# Altium footprint library Custom2.PcbLib: 99 footprints (part 5 of 7)
Each footprint in its own frame and in the unit in brackets; x right, y up, seen from the top. Pads: shape width x height; smd on the part's side, far side on the other; paste and mask are expansions set on the pad; w line width, h text height; cw(c..) or ccw(c..) is an arc to the next point about the centre after c.
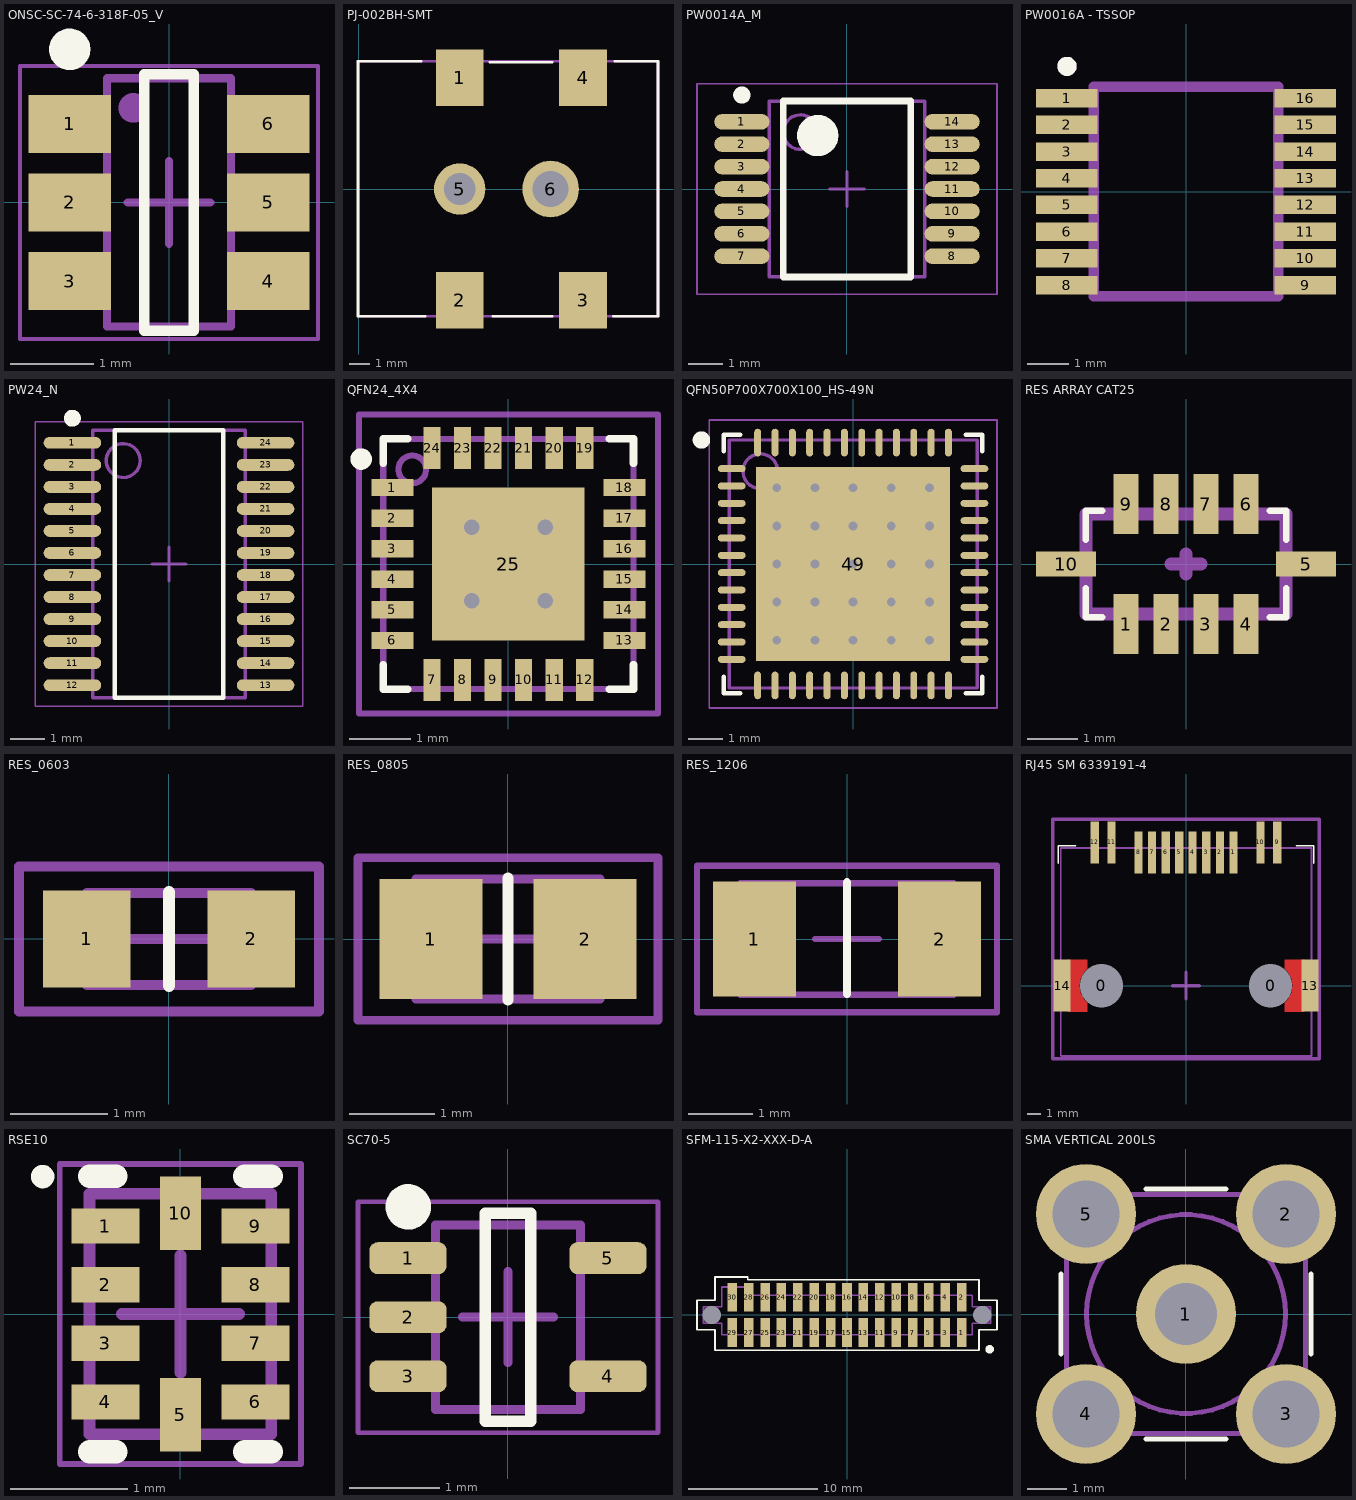
[diagram p4: the footprints below, top view; thin cyan lines are the x and y axes]

## ONSC-SC-74-6-318F-05_V [mm]
pads (6):
  rect 1x0.7 smd: 1(-1.2,0.95) 2(-1.2,0) 3(-1.2,-0.95) 4(1.2,-0.95) 5(1.2,0) 6(1.2,0.95)
Top Overlay:
  circle w0.25: c-1.2,1.85 r0.125
  lines w0.127: -0.3,-1.55 0.3,-1.55 0.3,1.55 -0.3,1.55 -0.3,-1.55
Mechanical 13:
  circle w0.254: c-0.432,1.143 r0.051
  lines w0.1: -0.75,-1.5 -0.75,1.5 0.75,1.5 0.75,-1.5 -0.75,-1.5
  text "'.Designator'" at -1.524,1.422 h0.76
Mechanical 15:
  lines w0.05: -1.8,-1.65 -1.8,1.65 1.8,1.65 1.8,-1.65 -1.8,-1.65
  lines w0.1: -0.5,0 0.5,0 ; 0,-0.5 0,0.5
3D body "NUD3124.step": height 0.95, standoff -0.07, extent -1.386,-1.5 1.385,1.5
3D body: height 0.97, standoff 0.94, extent -0.483,0.763 0.023,1.27

## PJ-002BH-SMT [mil]
pads (6):
  rect 93x110 smd: 1(197,217) 2(197,-217) 3(437,-217) 4(437,217)
  round 100 hole 62: 5(197,0)
  round 110 hole 70: 6(374,0)
Top Overlay:
  lines w5: 122,249 -1,249 -1,-248 130,-248 ; 256,247 377,247 ; 261,-248 377,-248 ; 496,-248 583,-248 583,249 499,249
Mechanical 13:
  lines w5: -1,249 -0.69,248.69 -0.69,-247.91 -0.6,-248 583,-248 583,249 -1,249
  text "'.Designator'" at 241.82,-19.83 h30
3D body "PJ-002BH-SMT.STEP": height 433.55, standoff -46.76, extent -0.69,-248.19 582.22,248.15

## PW0014A_M [mm] "SOP, 14-Leads, Body 5.1x4.5mm, Pitch 0.65mm, IPC Low Density"
height 1.2
pads (14):
  oval 1.6x0.45 smd: 1(-3.05,1.95) 2(-3.05,1.3) 3(-3.05,0.65) 4(-3.05,0) 5(-3.05,-0.65) 6(-3.05,-1.3) 7(-3.05,-1.95) 8(3.05,-1.95) 9(3.05,-1.3) 10(3.05,-0.65) 11(3.05,0) 12(3.05,0.65) 13(3.05,1.3) 14(3.05,1.95)
Top Overlay:
  circle w0.25: c-3.05,2.725 r0.125
  circle w0.6: c-0.85,1.55 r0.3
  lines w0.2: -1.85,-2.55 -1.85,2.55 1.85,2.55 1.85,-2.55 -1.85,-2.55
Mechanical 13:
  circle w0.1: c-1.35,1.65 r0.5
  lines w0.1: -2.25,-2.55 -2.25,2.55 2.25,2.55 2.25,-2.55 -2.25,-2.55
Mechanical 15:
  lines w0.05: -4.35,-3.05 -4.35,3.05 4.35,3.05 4.35,-3.05 -4.35,-3.05
  lines w0.1: -0.5,0 0.5,0 ; 0,-0.5 0,0.5
3D body "PW0014AakaMTC14.stp": height 1, standoff 0, extent -3.21,-2.5 3.21,2.5

## PW0016A - TSSOP [mm] "TSSOP"
height 1.2
pads (16):
  rect 1.5x0.45 smd mask+0.051: 1(-2.9,2.275) 2(-2.9,1.625) 3(-2.9,0.975) 4(-2.9,0.325) 5(-2.9,-0.325) 6(-2.9,-0.975) 7(-2.9,-1.625) 8(-2.9,-2.275) 9(2.9,-2.275) 10(2.9,-1.625) 11(2.9,-0.975) 12(2.9,-0.325) 13(2.9,0.325) 14(2.9,0.975) 15(2.9,1.625) 16(2.9,2.275)
Top Overlay:
  circle w0.254: c-2.896,3.048 r0.105
Mechanical 1:
  circle w0.254: c-2.896,3.048 r0.105
  lines w0.254: -2.25,-2.55 2.25,-2.55 2.25,2.55 -2.25,2.55 -2.25,-2.55
3D body "PW16.step": height 1.2, standoff 0, extent -3.327,-2.553 3.277,2.553

## PW24_N [mm]
pads (24):
  oval 1.7x0.35 smd: 1(-2.85,3.575) 2(-2.85,2.925) 3(-2.85,2.275) 4(-2.85,1.625) 5(-2.85,0.975) 6(-2.85,0.325) 7(-2.85,-0.325) 8(-2.85,-0.975) 9(-2.85,-1.625) 10(-2.85,-2.275) 11(-2.85,-2.925) 12(-2.85,-3.575) 13(2.85,-3.575) 14(2.85,-2.925) 15(2.85,-2.275) 16(2.85,-1.625) 17(2.85,-0.975) 18(2.85,-0.325) 19(2.85,0.325) 20(2.85,0.975) 21(2.85,1.625) 22(2.85,2.275) 23(2.85,2.925) 24(2.85,3.575)
Top Overlay:
  circle w0.25: c-2.85,4.3 r0.125
  lines w0.127: -1.6,-3.95 -1.6,3.95 1.6,3.95 1.6,-3.95 -1.6,-3.95
Mechanical 13:
  circle w0.1: c-1.35,3.05 r0.5
  lines w0.1: -2.25,-3.95 -2.25,3.95 2.25,3.95 2.25,-3.95 -2.25,-3.95
  text "'.Designator'" at -0.94,0.483 h0.76
Mechanical 15:
  lines w0.05: -3.95,-4.2 -3.95,4.2 3.95,4.2 3.95,-4.2 -3.95,-4.2
  lines w0.1: -0.5,0 0.5,0 ; 0,-0.5 0,0.5
3D body: height 1.22, standoff 1.19, extent -1.854,2.543 -0.842,3.557
3D body: height 1.2, standoff 0, extent -2.25,-3.95 2.25,3.95

## QFN24_4X4 [mm]
pads (25):
  rect 0.69x0.28 smd: 1(-1.9,1.25) 2(-1.9,0.75) 3(-1.9,0.25) 4(-1.9,-0.25) 5(-1.9,-0.75) 6(-1.9,-1.25) 13(1.9,-1.25) 14(1.9,-0.75) 15(1.9,-0.25) 16(1.9,0.25) 17(1.9,0.75) 18(1.9,1.25)
  rect 0.28x0.69 smd: 7(-1.25,-1.9) 8(-0.75,-1.9) 9(-0.25,-1.9) 10(0.25,-1.9) 11(0.75,-1.9) 12(1.25,-1.9) 19(1.25,1.9) 20(0.75,1.9) 21(0.25,1.9) 22(-0.25,1.9) 23(-0.75,1.9) 24(-1.25,1.9)
  rect 2.5x2.5 smd: 25(0,0)
via 0.6,0.6 diameter 0.508 hole 0.254
via -0.6,0.6 diameter 0.508 hole 0.254
via 0.6,-0.6 diameter 0.508 hole 0.254
via -0.6,-0.6 diameter 0.508 hole 0.254
Top Overlay:
  lines w0.127: -2.05,-1.651 -2.05,-2.05 -1.651,-2.05 ; -2.05,1.651 -2.05,2.05 -1.651,2.05 ; 1.651,-2.05 2.05,-2.05 2.05,-1.651 ; 1.651,2.05 2.05,2.05 2.05,1.651
  lines w0.25: -2.431,1.672 ccw(c-2.413,1.719) -2.431,1.672
Mechanical 13:
  lines w0.1: -2.05,-2.05 2.05,-2.05 2.05,2.05 -2.05,2.05 -2.05,-2.05 ; -1.735,1.389 ccw(c-1.575,1.549) -1.735,1.389
  text "'.Designator'" at -0.483,1.041 h0.76
Mechanical 15:
  lines w0.1: -0.5,0 0.5,0 ; 0,-0.5 0,0.5 ; -2.45,-2.45 2.45,-2.45 2.45,2.45 -2.45,2.45 -2.45,-2.45
3D body: height 1, standoff 0.02, extent -2.05,-2.05 2.05,2.05
3D body: height 1.04, standoff 1.02, extent -1.827,1.296 -1.321,1.803

## QFN50P700X700X100_HS-49N [mm]
pads (49):
  oval 0.8x0.2 smd: 1(-3.5,2.75) 2(-3.5,2.25) 3(-3.5,1.75) 4(-3.5,1.25) 5(-3.5,0.75) 6(-3.5,0.25) 7(-3.5,-0.25) 8(-3.5,-0.75) 9(-3.5,-1.25) 10(-3.5,-1.75) 11(-3.5,-2.25) 12(-3.5,-2.75) 25(3.5,-2.75) 26(3.5,-2.25) 27(3.5,-1.75) 28(3.5,-1.25) 29(3.5,-0.75) 30(3.5,-0.25) 31(3.5,0.25) 32(3.5,0.75) 33(3.5,1.25) 34(3.5,1.75) 35(3.5,2.25) 36(3.5,2.75)
  oval 0.2x0.8 smd: 13(-2.75,-3.5) 14(-2.25,-3.5) 15(-1.75,-3.5) 16(-1.25,-3.5) 17(-0.75,-3.5) 18(-0.25,-3.5) 19(0.25,-3.5) 20(0.75,-3.5) 21(1.25,-3.5) 22(1.75,-3.5) 23(2.25,-3.5) 24(2.75,-3.5) 37(2.75,3.5) 38(2.25,3.5) 39(1.75,3.5) 40(1.25,3.5) 41(0.75,3.5) 42(0.25,3.5) 43(-0.25,3.5) 44(-0.75,3.5) 45(-1.25,3.5) 46(-1.75,3.5) 47(-2.25,3.5) 48(-2.75,3.5)
  rect 5.6x5.6 smd paste-2.794: 49(0,0)
via 2.2,-2.2 diameter 0.508 hole 0.254
via 1.1,-2.2 diameter 0.508 hole 0.254
via 0,-2.2 diameter 0.508 hole 0.254
via -1.1,-2.2 diameter 0.508 hole 0.254
via -2.2,-2.2 diameter 0.508 hole 0.254
via 2.2,-1.1 diameter 0.508 hole 0.254
via 1.1,-1.1 diameter 0.508 hole 0.254
via 0,-1.1 diameter 0.508 hole 0.254
via -1.1,-1.1 diameter 0.508 hole 0.254
via -2.2,-1.1 diameter 0.508 hole 0.254
via 2.2,0 diameter 0.508 hole 0.254
via 1.1,0 diameter 0.508 hole 0.254
via 0,0 diameter 0.508 hole 0.254
via -1.1,0 diameter 0.508 hole 0.254
via -2.2,0 diameter 0.508 hole 0.254
via 2.2,1.1 diameter 0.508 hole 0.254
via 1.1,1.1 diameter 0.508 hole 0.254
via 0,1.1 diameter 0.508 hole 0.254
via -1.1,1.1 diameter 0.508 hole 0.254
via -2.2,1.1 diameter 0.508 hole 0.254
via 2.2,2.2 diameter 0.508 hole 0.254
via 1.1,2.2 diameter 0.508 hole 0.254
via 0,2.2 diameter 0.508 hole 0.254
via -1.1,2.2 diameter 0.508 hole 0.254
via -2.2,2.2 diameter 0.508 hole 0.254
Top Overlay:
  circle w0.25: c-4.375,3.575 r0.125
  lines w0.127: -3.725,-3.25 -3.725,-3.725 -3.25,-3.725 ; -3.725,3.25 -3.725,3.725 -3.25,3.725 ; 3.25,-3.725 3.725,-3.725 3.725,-3.25 ; 3.25,3.725 3.725,3.725 3.725,3.25
Top Paste:
  circle w0.254: c-2.525,1.65 r0.1
  circle w0.254: c-2.525,0.55 r0.1
  circle w0.254: c-2.525,-0.55 r0.1
  circle w0.254: c-2.525,-1.65 r0.1
  circle w0.254: c-1.65,-2.525 r0.1
  circle w0.254: c-0.55,-2.525 r0.1
  circle w0.254: c0.55,-2.525 r0.1
  circle w0.254: c1.65,-2.525 r0.1
  circle w0.254: c2.525,-1.65 r0.1
  circle w0.254: c2.525,-0.55 r0.1
  circle w0.254: c2.525,0.55 r0.1
  circle w0.254: c2.525,1.65 r0.1
  circle w0.254: c1.65,2.525 r0.1
  circle w0.254: c0.55,2.525 r0.1
  circle w0.254: c-1.65,2.525 r0.1
  circle w0.254: c-0.55,2.525 r0.1
  circle w0.635: c0.55,-1.65 r0.202
  circle w0.635: c0.55,-0.55 r0.202
  circle w0.635: c0.55,0.55 r0.202
  circle w0.635: c0.55,1.65 r0.202
  circle w0.635: c-0.55,1.65 r0.202
  circle w0.635: c-0.55,0.55 r0.202
  circle w0.635: c-0.55,-0.55 r0.202
  circle w0.635: c-0.55,-1.65 r0.202
  circle w0.635: c1.648,1.65 r0.202
  circle w0.635: c1.648,0.55 r0.202
  circle w0.635: c1.648,-0.55 r0.202
  circle w0.635: c1.648,-1.65 r0.202
  circle w0.635: c-1.65,-1.65 r0.202
  circle w0.635: c-1.65,-0.55 r0.202
  circle w0.635: c-1.65,0.55 r0.202
  circle w0.635: c-1.65,1.65 r0.202
Mechanical 13:
  circle w0.1: c-2.675,2.675 r0.5
  lines w0.1: -3.575,-3.575 3.575,-3.575 3.575,3.575 -3.575,3.575 -3.575,-3.575
  text "'.Designator'" at -0.94,-0.432 h0.76
Mechanical 15:
  lines w0.05: -4.15,-4.15 4.15,-4.15 4.15,4.15 -4.15,4.15 -4.15,-4.15
  lines w0.1: -0.5,0 0.5,0 ; 0,-0.5 0,0.5
3D body: height 1.04, standoff 1.02, extent -2.927,2.422 -2.421,2.929
3D body: height 1, standoff 0.08, extent -3.575,-3.575 3.575,3.575

## RES ARRAY CAT25 [mm]
pads (10):
  rect 0.5x1.2 smd: 1(-1.2,-1.2) 2(-0.4,-1.2) 3(0.4,-1.2) 4(1.2,-1.2) 6(1.2,1.2) 7(0.4,1.2) 8(-0.4,1.2) 9(-1.2,1.2)
  rect 1.2x0.5 smd: 5(2.4,0) 10(-2.4,0)
Top Overlay:
  lines w0.127: -2.007,-0.483 -2.007,-1.067 -1.676,-1.067 ; -2.007,0.483 -2.007,1.067 -1.676,1.067 ; 1.676,-1.067 2.007,-1.067 2.007,-0.483 ; 1.676,1.067 2.007,1.067 2.007,0.483
Mechanical 13:
  lines w0.127: -2,1 -2,-1 2,-1 ; -2,1.05 2,1.05 2,-1 ; 2,-1 2,-1
  text "'.Designator'" at -1.133,-0.526 h0.76
Mechanical 15:
  lines w0.254: -0.3,0 0.3,0 ; 0,-0.2 0,0.2 ; -2,-1 -2,1 2,1 2,-1 -2,-1
3D body "cat_25-j-1.STEP": height 0.56, standoff 0.01, extent -2,-1.05 2,1.05

## RES_0603 [mm]
pads (2):
  rect 0.9x1 smd: 1(-0.85,0) 2(0.85,0)
Top Overlay:
  lines w0.127: 0,-0.483 0,0.483
Mechanical 13:
  lines w0.1: -0.85,-0.475 0.85,-0.475 0.85,0.475 -0.85,0.475 -0.85,-0.475
  text "'.Designator'" at 1.194,-0.381 h0.76
Mechanical 15:
  lines w0.1: -0.475,0 0.475,0 ; 0,-0.475 0,0.475 ; -1.55,-0.75 1.55,-0.75 1.55,0.75 -1.55,0.75 -1.55,-0.75
3D body: height 0.6, standoff 0, extent -0.85,-0.475 0.85,0.475

## RES_0805 [mm]
pads (2):
  rect 1.2x1.4 smd: 1(-0.9,0) 2(0.9,0)
Top Overlay:
  lines w0.127: 0,-0.711 0,0.711
Mechanical 13:
  lines w0.1: -1.075,-0.7 1.075,-0.7 1.075,0.7 -1.075,0.7 -1.075,-0.7
  text "'.Designator'" at -1.194,1.016 h0.76
Mechanical 15:
  lines w0.1: -0.5,0 0.5,0 ; 0,-0.5 0,0.5 ; -1.75,-0.95 1.75,-0.95 1.75,0.95 -1.75,0.95 -1.75,-0.95
3D body: height 0.65, standoff 0, extent -1.075,-0.7 1.075,0.7

## RES_1206 [mm]
pads (2):
  rect 1.3x1.8 smd: 1(-1.45,0) 2(1.45,0)
Top Overlay:
  lines w0.127: 0,-0.864 0,0.889
Mechanical 13:
  lines w0.1: -1.675,-0.875 1.675,-0.875 1.675,0.875 -1.675,0.875 -1.675,-0.875
  text "'.Designator'" at 1.753,-0.711 h0.76
Mechanical 15:
  lines w0.1: -0.5,0 0.5,0 ; 0,-0.5 0,0.5 ; -2.35,-1.15 2.35,-1.15 2.35,1.15 -2.35,1.15 -2.35,-1.15
3D body: height 0.71, standoff 0, extent -1.675,-0.875 1.675,0.875

## RJ45 SM 6339191-4 [mm]
pads (16):
  round 1.524 hole 3.251 unplated: 0(-6.35,0) 0(6.35,0)
  rect 0.61x3.15 smd: 1(3.556,10) 2(2.54,10) 3(1.524,10) 4(0.5,10) 5(-0.508,10) 6(-1.524,10) 7(-2.54,10) 8(-3.556,10) 9(6.85,10.75) 10(5.58,10.75) 11(-5.58,10.75) 12(-6.85,10.75)
  rect 1.27x3.912 smd: 13(9.305,0) 14(-9.305,0)
Top Layer:
  region: 8.89,1.956 7.417,1.956 7.417,1.27 7.516,1.171 7.625,1.05 7.805,0.78 7.93,0.481 7.993,0.162 8.001,0 7.993,-0.162 7.93,-0.481 7.805,-0.78 7.625,-1.05 7.516,-1.171 7.417,-1.27 7.417,-1.956 8.89,-1.956
  region: -8.89,1.956 -7.417,1.956 -7.417,1.27 -7.516,1.171 -7.625,1.05 -7.806,0.78 -7.93,0.481 -7.993,0.162 -8.001,0 -7.993,-0.162 -7.93,-0.481 -7.806,-0.78 -7.625,-1.05 -7.516,-1.171 -7.417,-1.27 -7.417,-1.956 -8.89,-1.956
Top Overlay:
  lines w0.127: -9.6,9.2 -9.6,10.5 -8.3,10.5 ; 8.3,10.5 9.6,10.5 9.6,9.2
Mechanical 13:
  region: 8.89,1.956
  region: -8.89,1.956
  lines w0.127: -9.398,-5.258 -9.398,10.338 9.423,10.338 9.423,-5.283 -9.373,-5.283 -9.398,-5.258
  text "'.Designator'" at 0.575,2.49 h0.76
Mechanical 15:
  lines w0.254: -1,0 1,0 ; 0,-1 0,1 ; -10,-5.5 10,-5.5 10,12.5 -10,12.5 -10,-5.5
3D body "c-6339191-4-d-3d.stp": height 14.78, standoff -1.15, extent -9.351,-6.215 9.449,11.955

## RSE10 [mm] "QFN, 10-Leads, Body 1.5x2mm, Pitch 0.5mm, TI Recommended"
height 0.6
pads (10):
  rect 0.58x0.3 smd paste-0.025 mask+0.05: 1(-0.64,0.75) 2(-0.64,0.25) 3(-0.64,-0.25) 4(-0.64,-0.75) 6(0.64,-0.75) 7(0.64,-0.25) 8(0.64,0.25) 9(0.64,0.75)
  rect 0.35x0.63 smd paste-0.025 mask+0.05: 5(0,-0.86) 10(0,0.86)
Top Overlay:
  circle w0.1: c-1.175,1.173 r0.05
  lines w0.2: -0.775,-1.175 -0.55,-1.175 ; -0.775,1.175 -0.55,1.175 ; 0.55,-1.175 0.775,-1.175 ; 0.55,1.175 0.775,1.175
Mechanical 13:
  lines w0.1: -0.775,-1.025 -0.775,1.025 0.775,1.025 0.775,-1.025 -0.775,-1.025
  text "'.Designator'" at 2.286,-4.064 h0.76
Mechanical 15:
  lines w0.05: -1.03,-1.28 -1.03,1.28 1.03,1.28 1.03,-1.28 -1.03,-1.28
  lines w0.1: -0.5,0 0.5,0 ; 0,-0.5 0,0.5
3D body: height 0.6, standoff 0, extent -0.775,-1.025 0.775,1.025

## SC70-5 [mm]
pads (5):
  rrect50% 0.85x0.35 smd: 1(-1.1,0.65) 2(-1.1,0) 3(-1.1,-0.65) 4(1.1,-0.65) 5(1.1,0.65)
Top Overlay:
  circle w0.25: c-1.098,1.215 r0.125
  lines w0.127: -0.25,-1.143 0.25,-1.143 0.25,1.143 -0.25,1.143 -0.25,-1.143
Mechanical 13:
  lines w0.1: -0.8,-1.016 -0.8,1.016 0.8,1.016 0.8,-1.016 -0.8,-1.016
  lines w0.127: -1.245,-0.66 -0.813,-0.66 ; -1.245,0 -0.813,0 ; -1.245,0.66 -0.813,0.66 ; 0.813,-0.66 1.168,-0.66 ; 0.813,0.66 1.168,0.66
  text "'.Designator'" at 2.845,-0.991 h0.76
Mechanical 15:
  lines w0.05: -1.651,-1.27 -1.651,1.27 1.651,1.27 1.651,-1.27 -1.651,-1.27
  lines w0.1: -0.5,0 0.5,0 ; 0,-0.5 0,0.5
3D body "SC70-5-1.STEP": height 0.95, standoff 0, extent -1.05,-1 1.05,1

## SFM-115-X2-XXX-D-A [mil]
pads (32):
  rect 29x87.5 smd mask+2: 1(350,-53.75) 2(350,53.75) 3(300,-53.75) 4(300,53.75) 5(250,-53.75) 6(250,53.75) 7(200,-53.75) 8(200,53.75) 9(150,-53.75) 10(150,53.75) 11(100,-53.75) 12(100,53.75) 13(50,-53.75) 14(50,53.75) 15(0,-53.75) 16(0,54.13) 17(-50,-53.75) 18(-50,53.75) 19(-100,-53.75) 20(-100,53.75) 21(-150,-53.75) 22(-150,53.75) 23(-200,-53.75) 24(-200,53.75) 25(-250,-53.75) 26(-250,53.75) 27(-300,-53.75) 28(-300,53.75) 29(-350,-53.75) 30(-350,53.75)
  round 0 hole 55 unplated: MH1(412.5,0) MH2(-412.5,0)
Top Overlay:
  circle w15.75: c435,-105 r5
  lines w5: -457.5,-45 -457.5,45 -402.5,45 -402.5,115.5 -302.5,115.5 -302.5,107.5 402.5,107.5 402.5,45 457.5,45 457.5,-45 402.5,-45 402.5,-107.5 -402.5,-107.5 -402.5,-45 -457.5,-45
Mechanical 13:
  lines w5: -437.5,-25 -437.5,25 -382.5,25 -382.5,85 -302.5,85 -302.5,60 382.5,60 382.5,25 437.5,25 437.5,-25 382.5,-25 382.5,-60 -382.5,-60 -382.5,-25 -437.5,-25
  text "'.Designator'" at -224.21,-19.64 h30
3D body "SFM-115-02-S-D-A-K-TR.stp": height 190.5, standoff -19.5, extent -438,-80.75 437,84.75

## SMA VERTICAL 200LS [mil]
pads (5):
  round 100 hole 62: 1(0,0)
  round 100 hole 67: 2(100,100) 3(100,-100) 4(-100,-100) 5(-100,100)
Top Overlay:
  lines w5: -125,-40 -125,40 ; -40,-125 40,-125 ; -40,125 40,125 ; 125,-40 125,40
Mechanical 13:
  circle w5: c0,0 r99.41
  lines w5: -119.68,-119.68 119.69,-119.68 ; -119.68,-119.68 -119.68,-119.68 ; -119.68,-119.68 -119.68,119.69 ; -119.68,119.69 119.69,119.69 ; -119.68,119.69 -119.68,119.69 ; 119.69,-119.68 119.69,119.69 ; 119.69,-119.68 119.69,-119.68 ; 119.69,119.69 119.69,119.69
  text "'.Designator'" at 15.54,-43.9 h30
3D body "Molex - 73391-0060(1).STEP": height 335.13, standoff -158.97, extent -119.68,-119.68 119.69,119.69